# Altium footprint library Connector.PcbLib: 231 footprints (part 13 of 15)
Each footprint in its own frame and in the unit in brackets; x right, y up, seen from the top. Pads: shape width x height; smd on the part's side, far side on the other; paste and mask are expansions set on the pad; w line width, h text height; cw(c..) or ccw(c..) is an arc to the next point about the centre after c.
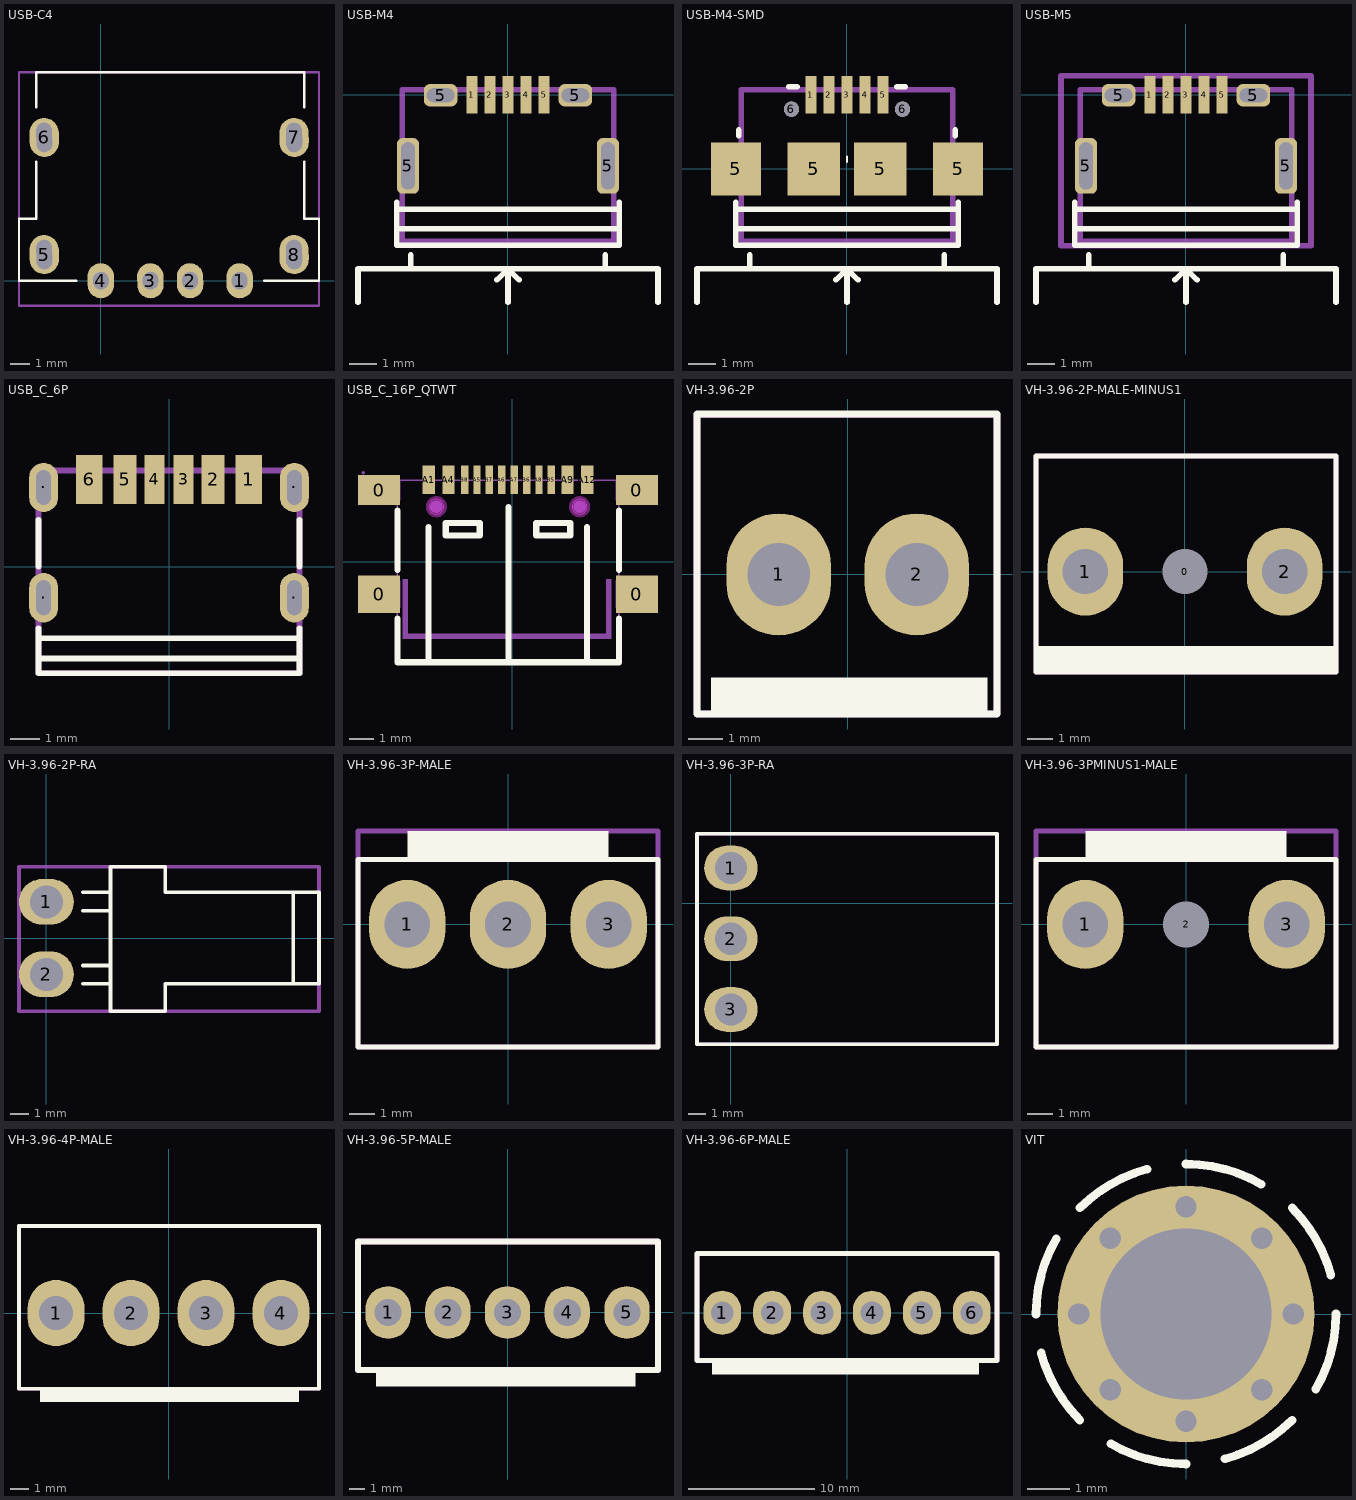
[diagram p12: the footprints below, top view; thin cyan lines are the x and y axes]

## USB-C4 [mm]
pads (8):
  oval 1.35x1.8 hole 0.8 slot 0.9 at 90.92 deg rot 0.92: 1(7.112,0) 2(4.572,0) 3(2.54,0) 4(0,0)
  oval 1.5x2 hole 0.8 slot 1.5 at 90.92 deg rot 0.92: 5(-2.9,1.34) 6(-2.9,7.34) 7(9.9,7.34) 8(9.9,1.34)
Top Overlay:
  lines w0.127: -3.302,6.096 -3.302,3.175 -4.191,3.175 -4.191,0 -1.27,0 ; -3.302,8.89 -3.302,10.668 10.414,10.668 10.414,8.89 ; 8.382,0 11.176,0 11.176,3.175 10.414,3.175 10.414,6.096
Mechanical 13:
  lines w0.127: -4.191,-1.27 -4.191,10.668 11.176,10.668 11.176,-1.27 -4.191,-1.27
  text ".Designator" at -2.9,1.34 h0.64
Mechanical 15:
  lines w0.127: -4.191,-1.27 -4.191,10.668 11.176,10.668 11.176,-1.27 -4.191,-1.27
  text ".Comment" at -2.9,1.34 h0.64
3D body: height 5.8, standoff 0, extent -4.191,0 11.176,10.668

## USB-M4 [mm]
pads (9):
  rect 0.4x1.35 smd mask+0.05: 1(-1.3,0) 2(-0.65,0) 3(0,0) 4(0.65,0) 5(1.3,0)
  rrect50% 0.8x2 hole 1.7 slot 0.5 at 0 deg: 5(-3.6,-2.57) 5(3.6,-2.57)
  rrect50% 1.2x0.8 hole 1 slot 0.5 at 90 deg: 5(-2.425,-0.025) 5(2.425,-0.025)
Top Overlay:
  lines w0.2: -5.4,-7.475 -5.4,-6.275 5.4,-6.275 5.4,-7.475 ; -4,-4.825 4,-4.825 ; -4,-4.125 4,-4.125 ; -4,-3.875 -4,-5.425 4,-5.425 4,-3.875 ; -3.5,-6.275 -3.5,-5.775 ; -0.4,-6.675 0,-6.275 ; 0,-7.475 0,-6.275 ; 0.4,-6.675 0,-6.275 ; 3.5,-6.275 3.5,-5.775
Mechanical 13:
  text ".Designator" at -2.35,-2.6 h1
Mechanical 15:
  text ".Comment" at -2.3,-2.55 h1
Mechanical 16:
  lines w0.2: -3.8,-5.275 -3.8,0.175 3.8,0.175 3.8,-5.275 -3.8,-5.275
3D body "10118193.step": height 2.85, standoff -0.75, extent -3.929,-5.435 3.928,0.225

## USB-M4-SMD [mm]
pads (11):
  rect 0.4x1.35 smd mask+0.05: 1(-1.3,2.675) 2(-0.65,2.675) 3(0,2.675) 4(0.65,2.675) 5(1.3,2.675)
  rect 1.8x1.9 smd paste-10: 5(-4,0) 5(4,0)
  rect 1.9x1.9 smd paste-10: 5(-1.2,0) 5(1.2,0)
  round 0.55 hole 0.55 unplated: 6(-2,2.15) 6(2,2.15)
Top Overlay:
  lines w0.08: 0,0.25 0,0.45
  lines w0.2: -5.4,-4.8 -5.4,-3.6 5.4,-3.6 5.4,-4.8 ; -4,-2.15 4,-2.15 ; -4,-1.45 4,-1.45 ; -4,-1.2 -4,-2.75 4,-2.75 4,-1.2 ; -3.9,1.2 -3.9,1.4 ; -3.5,-3.6 -3.5,-3.1 ; -2.1,2.95 -1.8,2.95 ; -0.4,-4 0,-3.6 ; 0,-4.8 0,-3.6 ; 0.4,-4 0,-3.6 ; 1.8,2.95 2.1,2.95 ; 3.5,-3.6 3.5,-3.1 ; 3.9,1.2 3.9,1.4
Mechanical 13:
  text ".Designator" at 0,0 h0.64
Mechanical 15:
  text ".Comment" at 0,0 h0.64
Mechanical 16:
  lines w0.2: -3.8,-2.6 3.8,-2.6 3.8,2.85 -3.8,2.85 -3.8,-2.6
3D body "10118193.step": height 2.85, standoff -0.75, extent -3.929,-2.76 3.928,2.9

## USB-M5 [mm]
pads (9):
  rect 0.4x1.35 smd mask+0.05: 1(-1.3,0) 2(-0.65,0) 3(0,0) 4(0.65,0) 5(1.3,0)
  rrect50% 0.8x2 hole 1.7 slot 0.5 at 0 deg: 5(-3.6,-2.57) 5(3.6,-2.57)
  rrect50% 1.2x0.8 hole 1 slot 0.5 at 90 deg: 5(-2.425,-0.025) 5(2.425,-0.025)
Top Overlay:
  lines w0.2: -5.4,-7.475 -5.4,-6.275 5.4,-6.275 5.4,-7.475 ; -4,-4.825 4,-4.825 ; -4,-4.125 4,-4.125 ; -4,-3.875 -4,-5.425 4,-5.425 4,-3.875 ; -3.5,-6.275 -3.5,-5.775 ; -0.4,-6.675 0,-6.275 ; 0,-7.475 0,-6.275 ; 0.4,-6.675 0,-6.275 ; 3.5,-6.275 3.5,-5.775
Mechanical 13:
  lines w0.2: -4.5,-5.435 4.5,-5.435 4.5,0.675 -4.5,0.675 -4.5,-5.435
  text ".Designator" at -2.35,-2.6 h1
Mechanical 15:
  text ".Comment" at -2.3,-2.55 h1
Mechanical 16:
  lines w0.2: -3.8,-5.275 3.8,-5.275 3.8,0.175 -3.8,0.175 -3.8,-5.275
3D body "10118193.step": height 2.85, standoff -0.75, extent -3.929,-5.435 3.928,0.225

## USB_C_6P [mm]
pads (10):
  rect 0.9x1.7 smd mask+0.05: 1(2.75,3) 6(-2.75,3)
  rect 0.8x1.7 smd mask+0.05: 2(1.52,3) 5(-1.52,3)
  rect 0.7x1.7 smd mask+0.05: 3(0.5,3) 4(-0.5,3)
  rrect100% 1x1.7 hole 1.2 slot 0.5 at 0 deg: .(-4.32,-1.075) .(-4.32,2.725) .(4.32,-1.075) .(4.32,2.725)
Top Overlay:
  lines w0.2: -4.5,-3.174 4.5,-3.174 ; -4.5,-2.474 4.5,-2.474 ; -4.5,-2.125 -4.5,-3.675 4.5,-3.675 4.5,-2.125 ; -4.5,0 -4.5,1.615 ; 4.5,0 4.5,1.615
Mechanical 13:
  lines w0.2: -4.5,-3.675 4.5,-3.675 4.5,3.305 -4.5,3.305 -4.5,-3.675
  text ".Designator" at -2.35,-0.05 h1
Mechanical 15:
  text ".Comment" at -2.3,0 h1
3D body: height 3.16, standoff 0, extent -4.5,-3.675 4.5,3.305

## USB_C_16P_QTWT [mm]
pads (16):
  rect 1.7x1.5 smd: 0(-5.373,-1.314) 0(5.027,-1.314)
  rect 1.7x1.2 smd: 0(-5.373,2.886) 0(5.027,2.886)
  rect 0.5x1.14 smd: A1(-3.373,3.303) A4(-2.573,3.303) A9(2.227,3.303) A12(3.027,3.303)
  rect 0.3x1.14 smd: A5(-1.423,3.303) A6(-0.423,3.303) A7(0.077,3.303) A8(1.077,3.304) B5(1.577,3.303) B6(0.577,3.303) B7(-0.923,3.303) B8(-1.923,3.304)
Top Overlay:
  lines w0.254: -4.633,-2.295 -4.633,-4.054 4.307,-4.054 4.307,-2.295 ; -4.633,-0.333 -4.633,2.055 ; -3.383,-4.054 -3.383,1.396 ; -0.153,-4.054 -0.153,2.196 ; 3.017,-4.054 3.017,1.396 ; 4.307,-0.333 4.307,2.056 ; -2.688,1.056 -1.318,1.056 -1.318,1.556 -2.688,1.556 -2.688,1.056 ; 0.972,1.056 2.342,1.056 2.342,1.556 0.972,1.556 0.972,1.056
Keep-Out Layer:
  board cut-out: 3.017,2.216 3.017,2.276 2.971,2.386 2.887,2.47 2.776,2.516 2.657,2.516 2.547,2.47 2.462,2.386 2.417,2.276 2.417,2.216 2.417,2.156 2.463,2.046 2.547,1.962 2.657,1.916 2.777,1.916 2.887,1.962 2.971,2.046 3.017,2.156
  board cut-out: -2.763,2.216 -2.763,2.276 -2.809,2.386 -2.893,2.47 -3.004,2.516 -3.123,2.516 -3.233,2.47 -3.318,2.386 -3.363,2.276 -3.363,2.216 -3.363,2.156 -3.318,2.046 -3.233,1.962 -3.123,1.916 -3.003,1.916 -2.893,1.962 -2.809,2.046 -2.763,2.156
Keep-Out Layer:
  circle w0.005: c2.717,2.216 r0.3
  circle w0.254: c2.717,2.216 r0.3
  circle w0.005: c-3.063,2.216 r0.3
  circle w0.254: c-3.063,2.216 r0.3
Mechanical 1:
  circle w0.005: c2.717,2.216 r0.3
  circle w0.005: c-3.063,2.216 r0.3
Mechanical 6:
  circle w0.25: c2.717,2.216 r0.125
  circle w0.25: c-3.063,2.216 r0.125
  region: 3.787,-3.104 -4.213,-3.104 -4.213,-2.904 3.787,-2.904
  region: 3.987,-0.704 3.987,-3.104 3.787,-3.104 3.787,-0.704
  region: -4.413,-0.704 -4.413,-3.104 -4.213,-3.104 -4.213,-0.704
Mechanical 15:
  region: -5.953,3.586 -5.953,3.611 -5.988,3.646 -6.038,3.646 -6.073,3.611 -6.073,3.586 -6.073,3.561 -6.038,3.526 -5.988,3.526 -5.953,3.561
  region: -2.023,3.586 -1.823,3.586 -1.823,2.986 -2.023,2.986
  region: -1.523,3.586 -1.323,3.586 -1.323,2.986 -1.523,2.986
  region: -1.023,3.586 -0.823,3.586 -0.823,2.986 -1.023,2.986
  region: -0.523,3.586 -0.323,3.586 -0.323,2.986 -0.523,2.986
  region: -0.023,3.586 0.177,3.586 0.177,2.986 -0.023,2.986
  region: 0.477,3.586 0.677,3.586 0.677,2.986 0.477,2.986
  region: 0.977,3.586 1.177,3.586 1.177,2.986 0.977,2.986
  region: 1.477,3.586 1.677,3.586 1.677,2.986 1.477,2.986
  region: -2.773,3.586 -2.373,3.586 -2.373,2.986 -2.773,2.986
  region: -3.573,3.586 -3.173,3.586 -3.173,2.986 -3.573,2.986
  region: 2.027,3.586 2.427,3.586 2.427,2.986 2.027,2.986
  region: 2.827,3.586 3.227,3.586 3.227,2.986 2.827,2.986
  region: 4.167,3.286 5.667,3.286 5.667,2.486 4.167,2.486
  region: -6.013,3.286 -4.513,3.286 -4.513,2.486 -6.013,2.486
  region: 4.167,-0.764 5.667,-0.764 5.667,-1.864 4.167,-1.864
  region: -6.013,-0.764 -4.513,-0.764 -4.513,-1.864 -6.013,-1.864
  lines w0.051: -4.643,-4.064 4.297,-4.064 4.297,3.286 -4.643,3.286 -4.643,-4.064
3D body "usb type c  smd 0.step": height 3.24, standoff -0.65, extent -5.822,-4.016 5.518,3.581

## VH-3.96-2P [mm]
pads (2):
  oval 3x3.5 hole 1.8: 1(-1.98,0) 2(1.98,0)
Top Overlay:
  rectangle: -3.93,-4 4,-2.959
  lines w0.2: -4.325,-4 4.278,-4 4.278,4.6 -4.325,4.6 -4.325,-4
Mechanical 13:
  lines w0.2: -4.325,-4 4.278,-4 4.278,4.588 -4.325,4.588 -4.325,-4
  text ".Designator" at -2.85,-0.241 h1.5
3D body "JST - VH - Thru (V) - 2Pin - 3.96mm.stp": height 10.36, standoff -3.96, extent -4.278,-4.039 4.278,4.648

## VH-3.96-2P-MALE-MINUS1 [mm]
pads (3):
  round 0.5 hole 1.8 unplated: 0(0,0)
  oval 3x3.5 hole 1.8: 1(-3.96,0) 2(3.96,0)
Top Overlay:
  rectangle: -5.92,-4 6,-2.959
  lines w0.2: -5.92,-4 -5.92,4.6 6,4.6 6,-4 -5.92,-4
Mechanical 13:
  lines w0.2: -5.92,-4 6,-4 6,4.6 -5.92,4.6 -5.92,-4
  text ".Designator" at -3.9,-0.3 h2
Mechanical 15:
  lines w0.2: -5.92,-4 6,-4 6,4.6 -5.92,4.6 -5.92,-4
  text ".Comment" at -2.9,-0.3 h2

## VH-3.96-2P-RA [mm]
pads (2):
  oval 3x2.5 hole 1.8: 1(0,1.98) 2(0,-1.98)
Top Overlay:
  lines w0.2: 2,-2.5 3.5,-2.5 ; 2,-1.5 3.5,-1.5 ; 2,1.5 3.5,1.5 ; 2,2.5 3.5,2.5 ; 13.5,-2.5 13.5,2.5 ; 3.5,-4 6.5,-4 6.5,-2.5 14.9,-2.5 14.9,2.5 6.5,2.5 6.5,3.9 3.5,3.9 3.5,-4
Mechanical 13:
  lines w0.2: -1.5,-4 -1.5,3.9 14.9,3.9 14.9,-4 -1.5,-4
  text ".Designator" at 2.5,-0.4 h1.5
Mechanical 15:
  lines w0.2: -1.5,-4 14.9,-4 14.9,3.9 -1.5,3.9 -1.5,-4
  text ".Comment" at 2.5,-0.4 h1.5
3D body "User Library-B2PS-VH.STEP": height 7.25, standoff -5.15, extent -0.57,-3.93 14.9,3.93

## VH-3.96-3P-MALE [mm]
pads (3):
  oval 3x3.5 hole 1.8: 1(-3.96,0) 2(0,0) 3(3.96,0)
Top Overlay:
  rectangle: -3.96,2.55 3.96,3.675
  lines w0.2: -5.9,-4.825 -5.9,2.55 5.9,2.55 5.9,-4.825 -5.9,-4.825
Mechanical 13:
  lines w0.2: -5.9,-4.825 -5.9,3.675 5.9,3.675 5.9,-4.825 -5.9,-4.825
  text ".Designator" at -4.625,-1.225 h2
3D body "B3P-VH.STEP": height 10.9, standoff -3.7, extent -5.91,-4.825 5.91,3.675

## VH-3.96-3P-RA [mm]
pads (3):
  oval 3x2.5 hole 1.8: 1(0,1.98) 2(0,-1.98) 3(0,-5.94)
Top Overlay:
  lines w0.2: -1.9,-7.89 14.9,-7.89 14.9,3.9 -1.9,3.9 -1.9,-7.89
Mechanical 13:
  lines w0.2: -1.9,-7.89 14.9,-7.89 14.9,3.9 -1.9,3.9 -1.9,-7.89
  text ".Designator" at 2.3,-2.1 h1.5
3D body "B3PS-VH.STEP": height 8.5, standoff -3.6, extent -0.57,-7.89 14.9,3.93

## VH-3.96-3PMINUS1-MALE [mm]
pads (3):
  oval 3x3.5 hole 1.8: 1(-3.96,0) 3(3.96,0)
  round 0.5 hole 1.8 unplated: 2(0,0)
Top Overlay:
  rectangle: -3.96,2.55 3.96,3.675
  lines w0.2: -5.9,-4.825 5.9,-4.825 5.9,2.55 -5.9,2.55 -5.9,-4.825
Mechanical 13:
  lines w0.2: -5.9,-4.825 5.9,-4.825 5.9,3.675 -5.9,3.675 -5.9,-4.825
  text ".Designator" at -4.625,-1.225 h2
3D body "B3P-VH.STEP": height 10.9, standoff -3.7, extent -5.91,-4.825 5.91,3.675

## VH-3.96-4P-MALE [mm]
pads (4):
  oval 3x3.5 hole 1.8: 1(-5.94,0) 2(-1.98,0) 3(1.98,0) 4(5.94,0)
Top Overlay:
  rectangle: -6.8,-4.7 6.891,-4.059
  lines w0.2: -7.9,-4 -7.9,4.6 7.948,4.6 7.948,-4 -7.9,-4
Mechanical 13:
  lines w0.2: -7.9,-4 7.948,-4 7.948,4.6 -7.9,4.6 -7.9,-4
  text ".Designator" at -5,-0.3 h2
Mechanical 15:
  lines w0.2: -7.9,-4 7.948,-4 7.948,4.6 -7.9,4.6 -7.9,-4
  text ".Comment" at -4.3,-0.3 h2
3D body "User Library-B4P-VH.STEP": height 10.9, standoff -3.7, extent -7.89,-3.95 7.89,4.55

## VH-3.96-5P-MALE [mm]
pads (5):
  oval 3x3.5 hole 1.8: 1(-7.92,0) 2(-3.96,0) 3(0,0) 4(3.96,0) 5(7.92,0)
Top Overlay:
  rectangle: -8.72,-4.9 8.48,-3.859
  lines w0.4: -9.92,-3.8 -9.92,4.7 9.98,4.7 9.98,-3.8 -9.92,-3.8
Mechanical 13:
  lines w0.4: -9.92,-3.8 9.98,-3.8 9.98,4.7 -9.92,4.7 -9.92,-3.8
  text ".Designator" at -7.92,0 h4
Mechanical 15:
  lines w0.4: -9.92,-3.8 9.98,-3.8 9.98,4.7 -9.92,4.7 -9.92,-3.8
  text ".Comment" at -7.92,0 h4
3D body "JST - VH - Thru (V) - 5Pin - 3.96mm.stp": height 10.36, standoff -3.96, extent -10.218,-4.039 10.218,4.648

## VH-3.96-6P-MALE [mm]
pads (6):
  oval 3x3.5 hole 1.8: 1(-9.9,0) 2(-5.94,0) 3(-1.98,0) 4(1.98,0) 5(5.94,0) 6(9.9,0)
Top Overlay:
  rectangle: -10.7,-4.9 10.487,-3.859
  lines w0.4: -11.9,-3.8 -11.9,4.7 11.9,4.7 11.9,-3.8 -11.9,-3.8
Mechanical 13:
  lines w0.4: -11.9,-3.8 11.9,-3.8 11.9,4.7 -11.9,4.7 -11.9,-3.8
  text ".Designator" at -9.9,0 h4
Mechanical 15:
  lines w0.4: -11.9,-3.8 11.9,-3.8 11.9,4.7 -11.9,4.7 -11.9,-3.8
  text ".Comment" at -9.9,0 h4
3D body "User Library-user_library-b6p-vh_asm.STEP": height 10.9, standoff -3.7, extent -11.715,-3.8 11.715,4.7

## VIT [mm]
pads (9):
  round 0.5 hole 0.5: ""(-2.5,0) ""(-1.768,-1.768) ""(-1.768,1.768) ""(0,-2.5) ""(0,2.5) ""(1.768,-1.768) ""(1.768,1.768) ""(2.5,0)
  round 6 hole 4: ""(0,0)
Top Overlay:
  lines w0.2: -3.5,0 cw(c0,0) -3.031,1.75 ; -3.381,-0.906 ccw(c0,0) -2.475,-2.475 ; -2.475,2.475 cw(c0,0) -0.906,3.381 ; -1.75,-3.031 ccw(c0,0) 0,-3.5 ; 0,3.5 cw(c0,0) 1.75,3.031 ; 0.906,-3.381 ccw(c0,0) 2.475,-2.475 ; 2.475,2.475 cw(c0,0) 3.381,0.906 ; 3.031,-1.75 ccw(c0,0) 3.5,0